# Altium footprint library Pcb-hionyPcbLib.PcbLib: 580 footprints (part 15 of 37)
Each footprint in its own frame and in the unit in brackets; x right, y up, seen from the top. Pads: shape width x height; smd on the part's side, far side on the other; paste and mask are expansions set on the pad; w line width, h text height; cw(c..) or ccw(c..) is an arc to the next point about the centre after c.
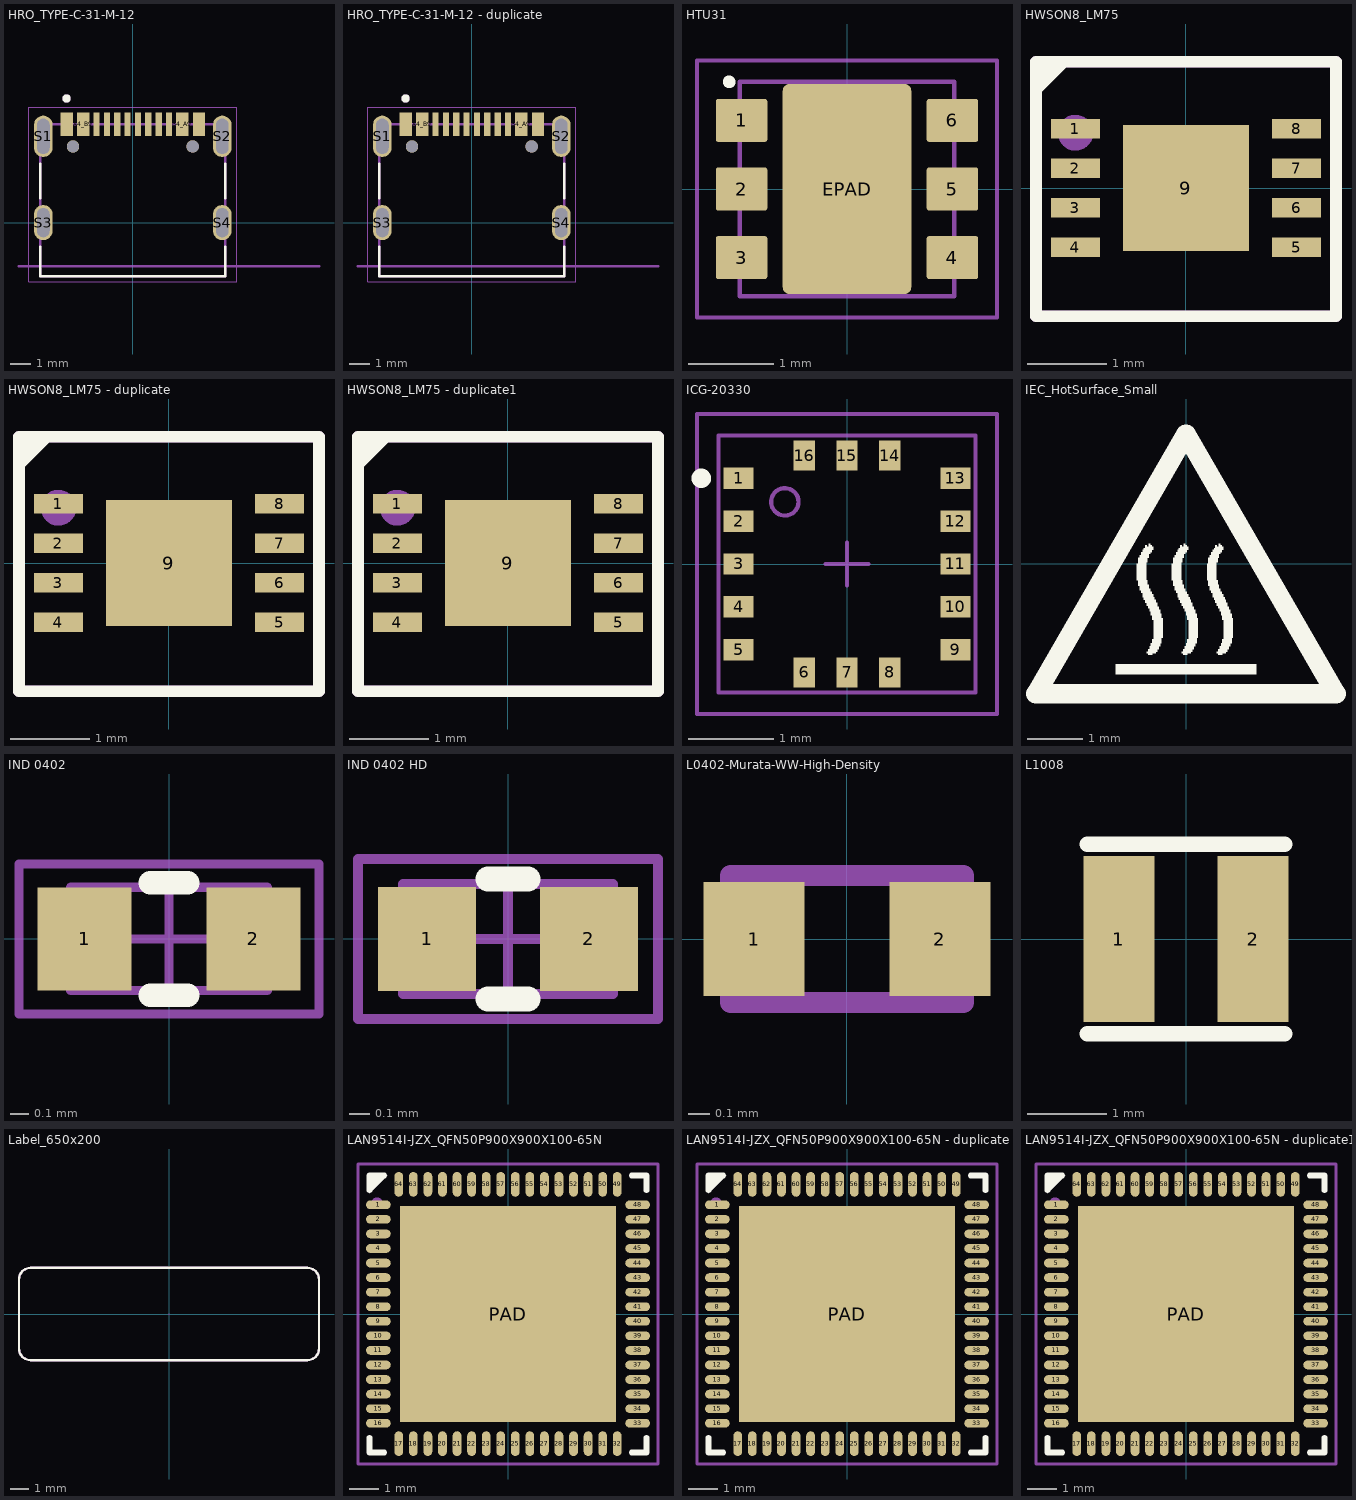
[diagram p14: the footprints below, top view; thin cyan lines are the x and y axes]

## HRO_TYPE-C-31-M-12 [mm]
height 3.26
pads (18):
  rect 0.6x1.14 smd mask+0.05: A1_B12(-3.2,4.75) A4_B9(-2.4,4.75) B1_A12(3.2,4.75) B4_A9(2.4,4.75)
  rect 0.3x1.14 smd mask+0.05: A5(-1.25,4.75) A6(-0.25,4.75) A7(0.25,4.75) A8(1.25,4.75) B5(1.75,4.75) B6(0.75,4.75) B7(-0.75,4.75) B8(-1.75,4.75)
  oval 0.9x2 hole 0.6 slot 1.7 at 90 deg: S1(-4.325,4.17) S2(4.325,4.17)
  oval 0.9x1.7 hole 0.6 slot 1.4 at 90 deg: S3(-4.325,0) S4(4.325,0)
  round 0.6 hole 0.6 unplated: ""(-2.89,3.68) ""(2.89,3.68)
Top Overlay:
  circle w0.2: c-3.2,6 r0.1
  lines w0.127: -4.47,-1.17 -4.47,-2.6 4.47,-2.6 4.47,-1.17 ; -4.47,1.17 -4.47,2.85 ; 4.47,1.17 4.47,2.85
Mechanical 13:
  circle w0.2: c-3.2,6 r0.1
  lines w0.127: -5.5,-2.11 9,-2.11 ; -4.47,-2.6 4.47,-2.6 4.47,4.75 -4.47,4.75 -4.47,-2.6
  text "PCB EDGE" at 5.2,-1.9 h0.61
Mechanical 15:
  lines w0.05: -5.025,-2.85 -5.025,5.57 5.025,5.57 5.025,-2.85 -5.025,-2.85
3D body "step_temp.STEP": height 3.31, standoff -0.99, extent -4.47,-2.6 4.47,5.305

## HRO_TYPE-C-31-M-12 - duplicate [mm]
height 3.26
pads (18):
  rect 0.6x1.14 smd mask+0.05: A1_B12(-3.2,4.75) A4_B9(-2.4,4.75) B1_A12(3.2,4.75) B4_A9(2.4,4.75)
  rect 0.3x1.14 smd mask+0.05: A5(-1.25,4.75) A6(-0.25,4.75) A7(0.25,4.75) A8(1.25,4.75) B5(1.75,4.75) B6(0.75,4.75) B7(-0.75,4.75) B8(-1.75,4.75)
  oval 0.9x2 hole 0.6 slot 1.7 at 90 deg: S1(-4.325,4.17) S2(4.325,4.17)
  oval 0.9x1.7 hole 0.6 slot 1.4 at 90 deg: S3(-4.325,0) S4(4.325,0)
  round 0.6 hole 0.6 unplated: ""(-2.89,3.68) ""(2.89,3.68)
Top Overlay:
  circle w0.2: c-3.2,6 r0.1
  lines w0.127: -4.47,-1.17 -4.47,-2.6 4.47,-2.6 4.47,-1.17 ; -4.47,1.17 -4.47,2.85 ; 4.47,1.17 4.47,2.85
Mechanical 13:
  circle w0.2: c-3.2,6 r0.1
  lines w0.127: -5.5,-2.11 9,-2.11 ; -4.47,-2.6 4.47,-2.6 4.47,4.75 -4.47,4.75 -4.47,-2.6
  text "PCB EDGE" at 5.2,-1.9 h0.61
Mechanical 15:
  lines w0.05: -5.025,-2.85 -5.025,5.57 5.025,5.57 5.025,-2.85 -5.025,-2.85
3D body "step_temp.STEP": height 3.31, standoff -0.99, extent -4.47,-2.6 4.47,5.305

## HTU31 [mm]
pads (7):
  rrect10% 0.6x0.5 smd mask+0.05: 1(-1.23,0.8) 2(-1.23,0) 3(-1.23,-0.8) 4(1.23,-0.8) 5(1.23,0) 6(1.23,0.8)
  rrect10% 1.5x2.45 smd mask+0.05: EPAD(0,0)
Top Overlay:
  circle w0.127: c-1.375,1.25 r0.01
Mechanical 11:
  text ".Designator" at -0.5,-0.5 h0.5
Mechanical 13:
  lines w0.05: -1.25,-1.25 1.25,-1.25 1.25,1.25 -1.25,1.25 -1.25,-1.25
Mechanical 15:
  lines w0.05: -0.2,0 0.2,0 ; 0,-0.2 0,0.2 ; -1.75,-1.5 -1.75,1.5 1.75,1.5 1.75,-1.5 -1.75,-1.5
3D body "c-10142048-00-a-3d.stp": height 0.93, standoff 0.01, extent -1.25,-1.25 1.25,1.25

## HWSON8_LM75 [mm]
pads (9):
  rect 0.625x0.25 smd mask+0.05: 1(-1.4,0.75) 2(-1.4,0.25) 3(-1.4,-0.25) 4(-1.4,-0.75) 5(1.4,-0.75) 6(1.4,-0.25) 7(1.4,0.25) 8(1.4,0.75)
  rect 1.6x1.6 smd mask+0.05: 9(0,0)
Top Overlay:
  region: -1.9,1.25 -1.9,1.6 -1.55,1.6
  lines w0.15: -1.9,1.25 -1.55,1.6 ; -1.9,-1.625 -1.9,1.6 1.9,1.6 1.9,-1.625 -1.9,-1.625
Mechanical 15:
  circle w0.254: c-1.4,0.7 r0.1
  lines w0.15: -0.3,0 0.3,0 ; 0,-0.3 0,0.3 ; -1.9,-1.625 -1.9,1.6 1.9,1.6 1.9,-1.625 -1.9,-1.625
  text ".Designator" at 0.725,0.575 h0.55
3D body "User Library-DFN-8.step": height 0.8, standoff 0, extent -1.51,-1.5 1.51,1.5

## HWSON8_LM75 - duplicate [mm]
pads (9):
  rect 0.625x0.25 smd mask+0.05: 1(-1.4,0.75) 2(-1.4,0.25) 3(-1.4,-0.25) 4(-1.4,-0.75) 5(1.4,-0.75) 6(1.4,-0.25) 7(1.4,0.25) 8(1.4,0.75)
  rect 1.6x1.6 smd mask+0.05: 9(0,0)
Top Overlay:
  region: -1.9,1.25 -1.9,1.6 -1.55,1.6
  lines w0.15: -1.9,1.25 -1.55,1.6 ; -1.9,-1.625 -1.9,1.6 1.9,1.6 1.9,-1.625 -1.9,-1.625
Mechanical 15:
  circle w0.254: c-1.4,0.7 r0.1
  lines w0.15: -0.3,0 0.3,0 ; 0,-0.3 0,0.3 ; -1.9,-1.625 -1.9,1.6 1.9,1.6 1.9,-1.625 -1.9,-1.625
  text ".Designator" at 0.725,0.575 h0.55
3D body "User Library-DFN-8.step": height 0.8, standoff 0, extent -1.51,-1.5 1.51,1.5

## HWSON8_LM75 - duplicate1 [mm]
pads (9):
  rect 0.625x0.25 smd mask+0.05: 1(-1.4,0.75) 2(-1.4,0.25) 3(-1.4,-0.25) 4(-1.4,-0.75) 5(1.4,-0.75) 6(1.4,-0.25) 7(1.4,0.25) 8(1.4,0.75)
  rect 1.6x1.6 smd mask+0.05: 9(0,0)
Top Overlay:
  region: -1.9,1.25 -1.9,1.6 -1.55,1.6
  lines w0.15: -1.9,1.25 -1.55,1.6 ; -1.9,-1.625 -1.9,1.6 1.9,1.6 1.9,-1.625 -1.9,-1.625
Mechanical 15:
  circle w0.254: c-1.4,0.7 r0.1
  lines w0.15: -0.3,0 0.3,0 ; 0,-0.3 0,0.3 ; -1.9,-1.625 -1.9,1.6 1.9,1.6 1.9,-1.625 -1.9,-1.625
  text ".Designator" at 0.725,0.575 h0.55
3D body "User Library-DFN-8.step": height 0.8, standoff 0, extent -1.51,-1.5 1.51,1.5

## ICG-20330 [mm]
pads (16):
  rect 0.35x0.25 smd mask+0.05: 1(-1.265,1) 2(-1.265,0.5) 3(-1.265,0) 4(-1.265,-0.5) 5(-1.265,-1) 9(1.265,-1) 10(1.265,-0.5) 11(1.265,0) 12(1.265,0.5) 13(1.265,1)
  rect 0.25x0.35 smd mask+0.05: 6(-0.5,-1.265) 7(0,-1.265) 8(0.5,-1.265) 14(0.5,1.265) 15(0,1.265) 16(-0.5,1.265)
Top Overlay:
  circle w0.127: c-1.7,1 r0.05
Mechanical 11:
  text ".Designator" at -0.825,-0.225 h0.5
Mechanical 13:
  circle w0.05: c-0.725,0.725 r0.16
  lines w0.05: -1.5,-1.5 -1.5,1.5 1.5,1.5 1.5,-1.5 -1.5,-1.5
Mechanical 15:
  lines w0.05: -0.25,0 0.25,0 ; 0,-0.25 0,0.25 ; 0,-0.1 0,0.1 ; -1.75,-1.75 -1.75,1.75 1.75,1.75 1.75,-1.75 -1.75,-1.75
3D body "User Library-LIS331AL.step": height 1.03, standoff 0.01, extent -1.5,-1.5 1.5,1.5

## IEC_HotSurface_Small [mm]
Top Overlay:
  drawing of 10 lines, arcs and shapes, not listed

## IND 0402 [mm]
pads (2):
  rect 0.5x0.55 smd: 1(-0.45,0) 2(0.45,0)
Top Overlay:
  lines w0.127: -0.1,-0.3 0.1,-0.3 ; -0.1,0.3 0.1,0.3
Mechanical 11:
  text ".Designator" at 0.45,0.35 h0.5
Mechanical 13:
  lines w0.05: -0.525,-0.275 0.525,-0.275 0.525,0.275 -0.525,0.275 -0.525,-0.275
Mechanical 15:
  lines w0.05: -0.275,0 0.275,0 ; 0,-0.275 0,0.275 ; -0.8,-0.4 0.8,-0.4 0.8,0.4 -0.8,0.4 -0.8,-0.4
3D body: height 0.55, standoff 0, extent -0.275,-0.275 0.275,0.275
3D body: height 0.55, standoff 0, extent -0.525,-0.275 -0.275,0.275
3D body: height 0.55, standoff 0, extent 0.275,-0.275 0.525,0.275

## IND 0402 HD [mm]
pads (2):
  rect 0.49x0.52 smd: 1(-0.405,0) 2(0.405,0)
Top Overlay:
  lines w0.127: -0.1,-0.3 0.1,-0.3 ; -0.1,0.3 0.1,0.3
Mechanical 11:
  text ".Designator" at -0.237,-0.25 h0.5
Mechanical 13:
  lines w0.05: -0.525,-0.275 -0.525,0.275 0.525,0.275 0.525,-0.275 -0.525,-0.275
Mechanical 15:
  lines w0.05: -0.275,0 0.275,0 ; 0,-0.275 0,0.275 ; -0.75,-0.4 -0.75,0.4 0.75,0.4 0.75,-0.4 -0.75,-0.4
3D body: height 0.55, standoff 0, extent 0.275,-0.275 0.525,0.275
3D body: height 0.55, standoff 0, extent -0.525,-0.275 -0.275,0.275
3D body: height 0.55, standoff 0, extent -0.275,-0.275 0.275,0.275

## L0402-Murata-WW-High-Density [mm]
pads (2):
  rect 0.48x0.54 smd: 1(-0.44,0) 2(0.44,0)
Mechanical 3:
  lines w0.1: -0.55,-0.3 0.55,-0.3 0.55,0.3 -0.55,0.3 -0.55,-0.3
  text ".Designator" at -1.346,-0.229 h0.2
3D body "LQW15AN_W05.stp": height 0.5, standoff 0, extent -0.5,-0.25 0.5,0.25

## L1008 [mm]
pads (2):
  rect 0.9x2.1 smd: 1(-0.85,0) 2(0.85,0)
Top Overlay:
  lines w0.2: -1.25,-1.2 1.25,-1.2 ; -1.25,1.2 1.25,1.2
3D body "Cyntec SDEM25201B L1008 v19.step": height 1.23, standoff 0, extent -1.25,-1 1.25,1

## Label_650x200 [mil]
pads (1):
  round 1 on Mech13: 0(0,0)
Top Overlay:
  lines w5: -325,-75 ccw(c-300,-75) -300,-100 300,-100 ccw(c300,-75) 325,-75 325,75 ccw(c300,75) 300,100 -300,100 ccw(c-300,75) -325,75 -325,-75
Top 3D Body:
  lines w5: -325,-75 ccw(c-300,-75) -300,-100 300,-100 ccw(c300,-75) 325,-75 325,75 ccw(c300,75) 300,100 -300,100 ccw(c-300,75) -325,75 -325,-75
  text ".Designator" at -60,-20 h40
3D body: height 1, standoff 0, extent -325.02,-100.02 325.02,100.02

## LAN9514I-JZX_QFN50P900X900X100-65N [mm]
pads (65):
  oval 0.85x0.3 smd mask+0.05: 1(-4.45,3.75) 2(-4.45,3.25) 3(-4.45,2.75) 4(-4.45,2.25) 5(-4.45,1.75) 6(-4.45,1.25) 7(-4.45,0.75) 8(-4.45,0.25) 9(-4.45,-0.25) 10(-4.45,-0.75) 11(-4.45,-1.25) 12(-4.45,-1.75) 13(-4.45,-2.25) 14(-4.45,-2.75) 15(-4.45,-3.25) 16(-4.45,-3.75) 33(4.45,-3.75) 34(4.45,-3.25) 35(4.45,-2.75) 36(4.45,-2.25) 37(4.45,-1.75) 38(4.45,-1.25) 39(4.45,-0.75) 40(4.45,-0.25) 41(4.45,0.25) 42(4.45,0.75) 43(4.45,1.25) 44(4.45,1.75) 45(4.45,2.25) 46(4.45,2.75) 47(4.45,3.25) 48(4.45,3.75)
  oval 0.3x0.85 smd mask+0.05: 17(-3.75,-4.45) 18(-3.25,-4.45) 19(-2.75,-4.45) 20(-2.25,-4.45) 21(-1.75,-4.45) 22(-1.25,-4.45) 23(-0.75,-4.45) 24(-0.25,-4.45) 25(0.25,-4.45) 26(0.75,-4.45) 27(1.25,-4.45) 28(1.75,-4.45) 29(2.25,-4.45) 30(2.75,-4.45) 31(3.25,-4.45) 32(3.75,-4.45) 49(3.75,4.45) 50(3.25,4.45) 51(2.75,4.45) 52(2.25,4.45) 53(1.75,4.45) 54(1.25,4.45) 55(0.75,4.45) 56(0.25,4.45) 57(-0.25,4.45) 58(-0.75,4.45) 59(-1.25,4.45) 60(-1.75,4.45) 61(-2.25,4.45) 62(-2.75,4.45) 63(-3.25,4.45) 64(-3.75,4.45)
  rect 7.4x7.4 smd mask+0.05: PAD(0,0)
Top Overlay:
  region: -4.75,4.15 -4.15,4.75 -4.75,4.75
  lines w0.2: -4.75,-4.25 -4.75,-4.75 -4.25,-4.75 ; -4.75,4.25 -4.75,4.75 -4.25,4.75 ; 4.25,-4.75 4.75,-4.75 4.75,-4.25 ; 4.25,4.75 4.75,4.75 4.75,4.25
Top Paste:
  region: 1.564,-1.56 3.12,-1.56 3.12,-3.127 1.564,-3.127
  region: -0.782,-1.56 0.78,-1.56 0.78,-3.127 -0.782,-3.127
  region: -3.123,-1.56 -1.56,-1.56 -1.56,-3.123 -3.123,-3.123
  region: -3.124,3.12 -1.56,3.12 -1.56,1.562 -3.124,1.562
  region: -0.782,3.12 0.78,3.12 0.78,1.563 -0.782,1.563
  region: 1.561,3.12 3.12,3.12 3.12,1.561 1.561,1.561
  region: 1.563,0.78 3.12,0.78 3.12,-0.781 1.563,-0.781
  region: -3.123,0.78 -1.56,0.78 -1.56,-0.781 -3.123,-0.781
  region: -0.781,0.78 0.78,0.78 0.78,-0.781 -0.781,-0.781
Mechanical 15:
  circle w0.2: c-4.5,3.8 r0.1
  lines w0.1: -5.15,-5.15 -5.15,5.15 5.15,5.15 5.15,-5.15 -5.15,-5.15
  lines w0.15: -0.9,0 0,0 ; 0,-0.9 0,0 ; 0,0.9 0,0 ; 0.9,0 0,0
  text ".Designator" at 0.95,1.8 h0.55
3D body "User Library-ZM7300G Series.step": height 0.9, standoff 0, extent -4.51,-4.51 4.51,4.51

## LAN9514I-JZX_QFN50P900X900X100-65N - duplicate [mm]
pads (65):
  oval 0.85x0.3 smd mask+0.05: 1(-4.45,3.75) 2(-4.45,3.25) 3(-4.45,2.75) 4(-4.45,2.25) 5(-4.45,1.75) 6(-4.45,1.25) 7(-4.45,0.75) 8(-4.45,0.25) 9(-4.45,-0.25) 10(-4.45,-0.75) 11(-4.45,-1.25) 12(-4.45,-1.75) 13(-4.45,-2.25) 14(-4.45,-2.75) 15(-4.45,-3.25) 16(-4.45,-3.75) 33(4.45,-3.75) 34(4.45,-3.25) 35(4.45,-2.75) 36(4.45,-2.25) 37(4.45,-1.75) 38(4.45,-1.25) 39(4.45,-0.75) 40(4.45,-0.25) 41(4.45,0.25) 42(4.45,0.75) 43(4.45,1.25) 44(4.45,1.75) 45(4.45,2.25) 46(4.45,2.75) 47(4.45,3.25) 48(4.45,3.75)
  oval 0.3x0.85 smd mask+0.05: 17(-3.75,-4.45) 18(-3.25,-4.45) 19(-2.75,-4.45) 20(-2.25,-4.45) 21(-1.75,-4.45) 22(-1.25,-4.45) 23(-0.75,-4.45) 24(-0.25,-4.45) 25(0.25,-4.45) 26(0.75,-4.45) 27(1.25,-4.45) 28(1.75,-4.45) 29(2.25,-4.45) 30(2.75,-4.45) 31(3.25,-4.45) 32(3.75,-4.45) 49(3.75,4.45) 50(3.25,4.45) 51(2.75,4.45) 52(2.25,4.45) 53(1.75,4.45) 54(1.25,4.45) 55(0.75,4.45) 56(0.25,4.45) 57(-0.25,4.45) 58(-0.75,4.45) 59(-1.25,4.45) 60(-1.75,4.45) 61(-2.25,4.45) 62(-2.75,4.45) 63(-3.25,4.45) 64(-3.75,4.45)
  rect 7.4x7.4 smd mask+0.05: PAD(0,0)
Top Overlay:
  region: -4.75,4.15 -4.15,4.75 -4.75,4.75
  lines w0.2: -4.75,-4.25 -4.75,-4.75 -4.25,-4.75 ; -4.75,4.25 -4.75,4.75 -4.25,4.75 ; 4.25,-4.75 4.75,-4.75 4.75,-4.25 ; 4.25,4.75 4.75,4.75 4.75,4.25
Top Paste:
  region: 1.564,-1.56 3.12,-1.56 3.12,-3.127 1.564,-3.127
  region: -0.782,-1.56 0.78,-1.56 0.78,-3.127 -0.782,-3.127
  region: -3.123,-1.56 -1.56,-1.56 -1.56,-3.123 -3.123,-3.123
  region: -3.124,3.12 -1.56,3.12 -1.56,1.562 -3.124,1.562
  region: -0.782,3.12 0.78,3.12 0.78,1.563 -0.782,1.563
  region: 1.561,3.12 3.12,3.12 3.12,1.561 1.561,1.561
  region: 1.563,0.78 3.12,0.78 3.12,-0.781 1.563,-0.781
  region: -3.123,0.78 -1.56,0.78 -1.56,-0.781 -3.123,-0.781
  region: -0.781,0.78 0.78,0.78 0.78,-0.781 -0.781,-0.781
Mechanical 15:
  circle w0.2: c-4.5,3.8 r0.1
  lines w0.1: -5.15,-5.15 -5.15,5.15 5.15,5.15 5.15,-5.15 -5.15,-5.15
  lines w0.15: -0.9,0 0,0 ; 0,-0.9 0,0 ; 0,0.9 0,0 ; 0.9,0 0,0
  text ".Designator" at 0.95,1.8 h0.55
3D body "User Library-ZM7300G Series.step": height 0.9, standoff 0, extent -4.51,-4.51 4.51,4.51

## LAN9514I-JZX_QFN50P900X900X100-65N - duplicate1 [mm]
pads (65):
  oval 0.85x0.3 smd mask+0.05: 1(-4.45,3.75) 2(-4.45,3.25) 3(-4.45,2.75) 4(-4.45,2.25) 5(-4.45,1.75) 6(-4.45,1.25) 7(-4.45,0.75) 8(-4.45,0.25) 9(-4.45,-0.25) 10(-4.45,-0.75) 11(-4.45,-1.25) 12(-4.45,-1.75) 13(-4.45,-2.25) 14(-4.45,-2.75) 15(-4.45,-3.25) 16(-4.45,-3.75) 33(4.45,-3.75) 34(4.45,-3.25) 35(4.45,-2.75) 36(4.45,-2.25) 37(4.45,-1.75) 38(4.45,-1.25) 39(4.45,-0.75) 40(4.45,-0.25) 41(4.45,0.25) 42(4.45,0.75) 43(4.45,1.25) 44(4.45,1.75) 45(4.45,2.25) 46(4.45,2.75) 47(4.45,3.25) 48(4.45,3.75)
  oval 0.3x0.85 smd mask+0.05: 17(-3.75,-4.45) 18(-3.25,-4.45) 19(-2.75,-4.45) 20(-2.25,-4.45) 21(-1.75,-4.45) 22(-1.25,-4.45) 23(-0.75,-4.45) 24(-0.25,-4.45) 25(0.25,-4.45) 26(0.75,-4.45) 27(1.25,-4.45) 28(1.75,-4.45) 29(2.25,-4.45) 30(2.75,-4.45) 31(3.25,-4.45) 32(3.75,-4.45) 49(3.75,4.45) 50(3.25,4.45) 51(2.75,4.45) 52(2.25,4.45) 53(1.75,4.45) 54(1.25,4.45) 55(0.75,4.45) 56(0.25,4.45) 57(-0.25,4.45) 58(-0.75,4.45) 59(-1.25,4.45) 60(-1.75,4.45) 61(-2.25,4.45) 62(-2.75,4.45) 63(-3.25,4.45) 64(-3.75,4.45)
  rect 7.4x7.4 smd mask+0.05: PAD(0,0)
Top Overlay:
  region: -4.75,4.15 -4.15,4.75 -4.75,4.75
  lines w0.2: -4.75,-4.25 -4.75,-4.75 -4.25,-4.75 ; -4.75,4.25 -4.75,4.75 -4.25,4.75 ; 4.25,-4.75 4.75,-4.75 4.75,-4.25 ; 4.25,4.75 4.75,4.75 4.75,4.25
Top Paste:
  region: 1.564,-1.56 3.12,-1.56 3.12,-3.127 1.564,-3.127
  region: -0.782,-1.56 0.78,-1.56 0.78,-3.127 -0.782,-3.127
  region: -3.123,-1.56 -1.56,-1.56 -1.56,-3.123 -3.123,-3.123
  region: -3.124,3.12 -1.56,3.12 -1.56,1.562 -3.124,1.562
  region: -0.782,3.12 0.78,3.12 0.78,1.563 -0.782,1.563
  region: 1.561,3.12 3.12,3.12 3.12,1.561 1.561,1.561
  region: 1.563,0.78 3.12,0.78 3.12,-0.781 1.563,-0.781
  region: -3.123,0.78 -1.56,0.78 -1.56,-0.781 -3.123,-0.781
  region: -0.781,0.78 0.78,0.78 0.78,-0.781 -0.781,-0.781
Mechanical 15:
  circle w0.2: c-4.5,3.8 r0.1
  lines w0.1: -5.15,-5.15 -5.15,5.15 5.15,5.15 5.15,-5.15 -5.15,-5.15
  lines w0.15: -0.9,0 0,0 ; 0,-0.9 0,0 ; 0,0.9 0,0 ; 0.9,0 0,0
  text ".Designator" at 0.95,1.8 h0.55
3D body "User Library-ZM7300G Series.step": height 0.9, standoff 0, extent -4.51,-4.51 4.51,4.51